# Altium footprint library PCBKU.PcbLib: 197 footprints (part 9 of 13)
Each footprint in its own frame and in the unit in brackets; x right, y up, seen from the top. Pads: shape width x height; smd on the part's side, far side on the other; paste and mask are expansions set on the pad; w line width, h text height; cw(c..) or ccw(c..) is an arc to the next point about the centre after c.
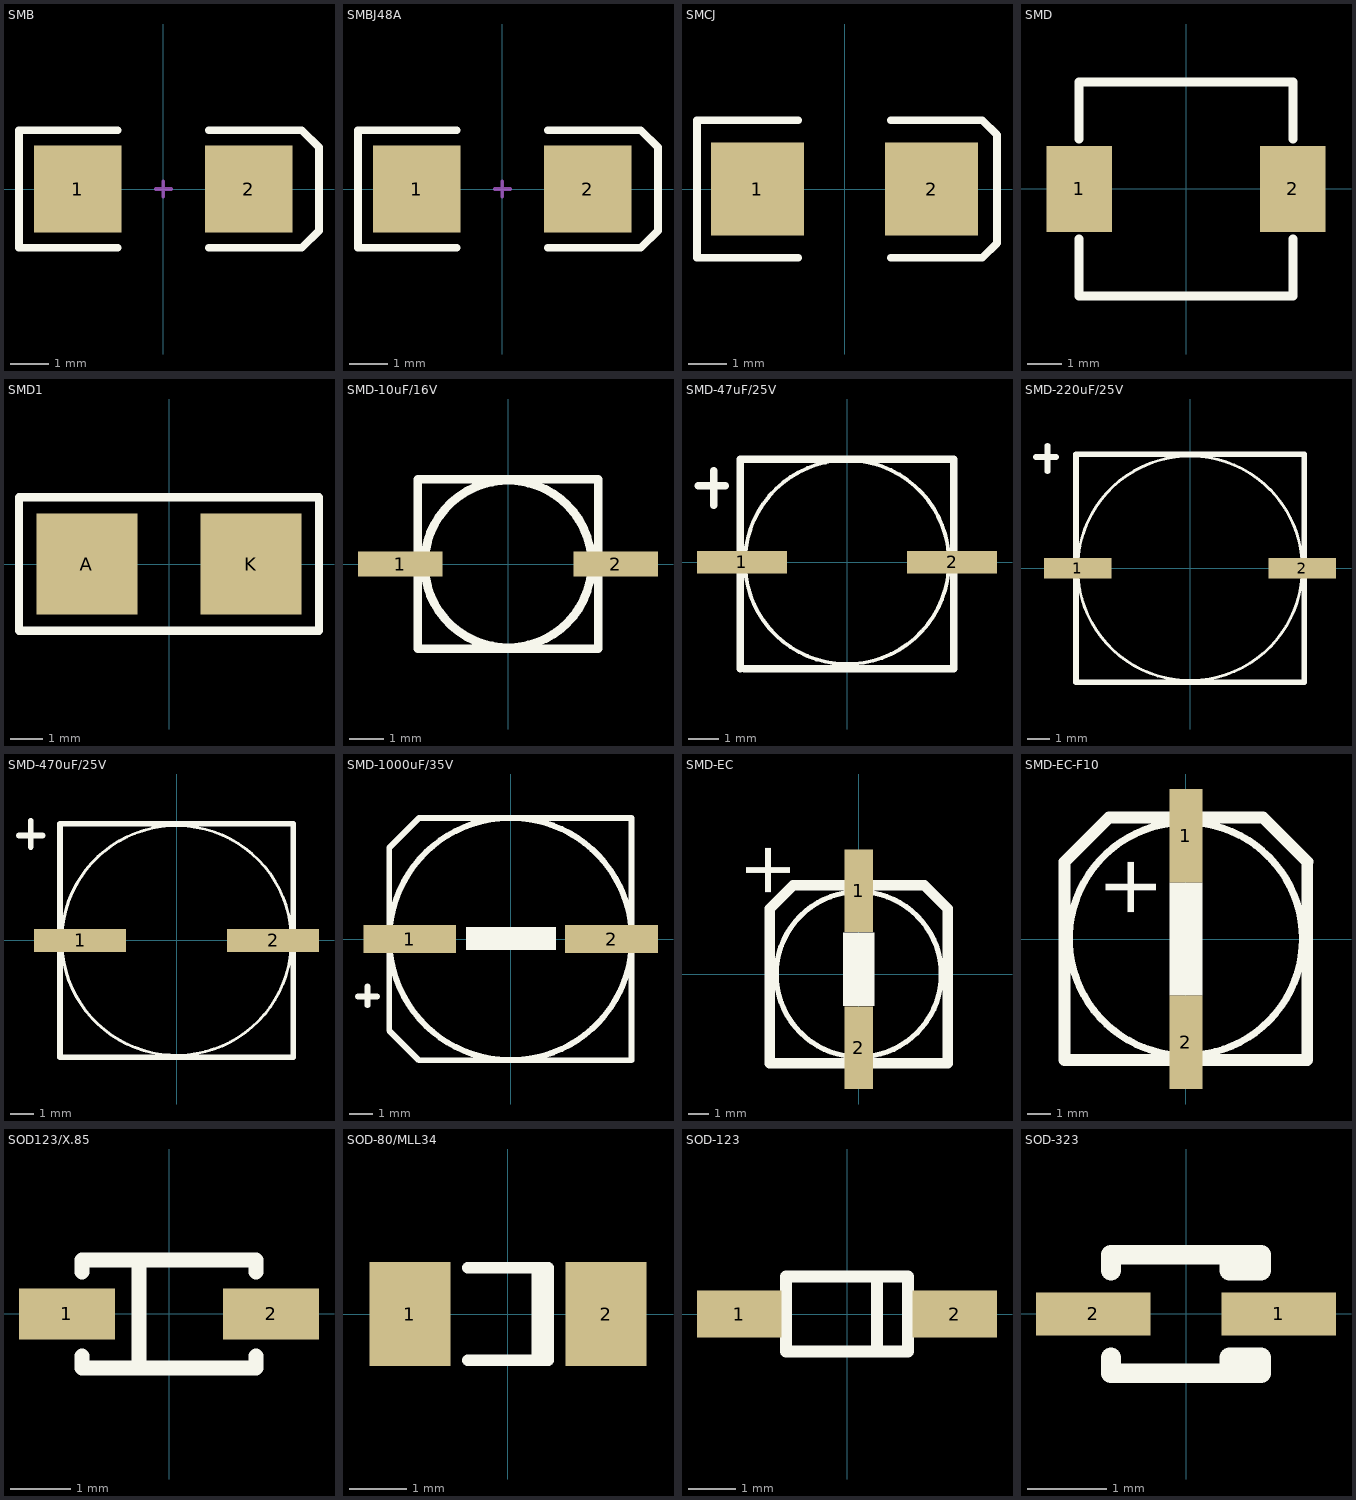
[diagram p8: the footprints below, top view; thin cyan lines are the x and y axes]

## SMB [mm] "DO-214-AA/SMB; 2 C-Bend Leads; Body 5.3 x 3.6 mm, inc. leads (LxW)"
height 2.54
pads (2):
  rect 2.3x2.3 smd: 1(-2.25,0) 2(2.25,0)
Top Overlay:
  lines w0.2: -1.2,-1.55 -3.8,-1.55 -3.8,1.55 -1.2,1.55 ; 1.2,-1.55 3.65,-1.55 4.1,-1.1 4.1,1.1 3.65,1.55 1.2,1.55
Mechanical 1:
  lines w0.1: -0.2,0 0.2,0 ; 0,-0.2 0,0.2

## SMBJ48A [mm]
pads (2):
  rect 2.3x2.3 smd: 1(-2.25,0) 2(2.25,0)
Top Overlay:
  lines w0.2: -1.2,-1.55 -3.8,-1.55 -3.8,1.55 -1.2,1.55 ; 1.2,-1.55 3.65,-1.55 4.1,-1.1 4.1,1.1 3.65,1.55 1.2,1.55
Mechanical 1:
  lines w0.1: -0.2,0 0.2,0 ; 0,-0.2 0,0.2

## SMCJ [mm]
pads (2):
  rect 2.4x2.4 smd: 1(-2.25,0) 2(2.25,0)
Top Overlay:
  lines w0.2: -1.2,-1.778 -3.81,-1.778 -3.81,1.778 -1.2,1.778 ; 1.2,-1.778 3.556,-1.778 3.937,-1.397 3.937,1.397 3.556,1.778 1.2,1.778

## SMD [mm]
pads (2):
  rect 1.9x2.5 smd: 1(-3.099,0) 2(3.099,0)
Top Overlay:
  lines w0.254: -3.099,-1.449 -3.099,-3.1 3.101,-3.1 3.101,-1.449 ; -3.099,1.449 -3.099,3.1 3.101,3.1 3.101,1.449
3D body: height 3, standoff 0.1, extent -3.337,-3.371 3.363,3.329

## SMD1 [mm]
pads (2):
  rect 3.067x3.067 smd: A(-2.5,0) K(2.5,0)
Top Overlay:
  lines w0.254: -4.572,-2.032 -4.572,1.524 -4.572,2.032 4.572,2.032 4.572,-2.032 -4.572,-2.032

## SMD-10uF/16V [mm]
pads (2):
  rect 2.5x0.75 smd: 1(-3.175,0) 2(3.175,0)
Top Overlay:
  circle w0.254: c0,0 r2.466
  lines w0.254: -2.667,-2.5 2.667,-2.5 2.667,2.5 -2.667,2.5 -2.667,-2.5

## SMD-47uF/25V [mm]
pads (2):
  rect 3x0.75 smd: 1(-3.5,0) 2(3.5,0)
Top Overlay:
  circle w0.127: c0,0 r3.4
  lines w0.254: -4.953,2.54 -4.064,2.54 ; -4.445,1.905 -4.445,3.048 ; -3.556,-3.556 -3.556,3.429 0,3.429 3.556,3.429 3.556,-3.556 -3.429,-3.556

## SMD-220uF/25V [mm]
pads (2):
  rect 3x0.9 smd: 1(-5,0) 2(5,0)
Top Overlay:
  circle w0.127: c0,0 r5
  lines w0.254: -6.858,4.953 -5.969,4.953 ; -6.35,4.318 -6.35,5.461 ; -5.08,-5.08 -5.08,5.08 5.08,5.08 5.08,-5.08 -5.08,-5.08

## SMD-470uF/25V [mm]
pads (2):
  rect 4x1 smd: 1(-4.2,0) 2(4.2,0)
Top Overlay:
  circle w0.127: c0,0 r5
  lines w0.254: -6.858,4.572 -5.842,4.572 ; -6.35,4.064 -6.35,5.207 ; -5.08,-5.08 5.08,-5.08 5.08,5.08 -4.445,5.08 -5.08,5.08 -5.08,-5.08

## SMD-1000uF/35V [mm]
pads (2):
  rect 4x1.2 smd: 1(-4.34,0) 2(4.34,0)
Top Overlay:
  circle w0.254: c0,0 r5.214
  rectangle: -1.93,-0.483 1.956,0.508
  lines w0.254: -6.566,-2.471 -5.753,-2.471 ; -6.159,-2.852 -6.159,-2.039 ; -5.22,-3.944 -5.22,3.93 -3.95,5.2 5.194,5.2 5.194,-5.214 -3.95,-5.214 -5.22,-3.944

## SMD-EC [mm]
pads (2):
  rect 1.4x4 smd: 1(0,4.049) 2(0,-3.556)
Top Overlay:
  circle w0.254: c0,0 r4
  region: -0.773,2.032 -0.773,-1.524 0.762,-1.524 0.762,2.032
  lines w0.508: -4.318,-4.318 4.318,-4.318 4.318,3.175 3.175,4.318 -3.175,4.318 -4.318,3.175 -4.318,-4.318
  text "+" at -5.461,6.477 h2.5

## SMD-EC-F10 [mm]
pads (2):
  rect 1.4x4 smd: 1(0,4.43) 2(0,-4.43)
Top Overlay:
  circle w0.305: c0,0.007 r5
  region: -0.701,2.424 -0.701,-2.419 0.707,-2.419 0.707,2.424
  lines w0.508: 5.2,3.307 5.2,-5.19 -5.201,-5.19 -5.201,3.31 -3.304,5.207 3.306,5.207 5.203,3.31
  text "+" at -3.44,3.649 h2.5

## SOD123/X.85 [mm]
height 1.1
pads (2):
  rect 1.6x0.85 smd: 1(-1.7,0) 2(1.7,0)
Top Overlay:
  lines w0.25: -1.45,-0.7 -1.45,-0.9 1.45,-0.9 1.45,-0.7 ; -1.45,0.7 -1.45,0.9 1.45,0.9 1.45,0.7 ; -0.5,-0.9 -0.5,0.9

## SOD-80/MLL34 [mm]
pads (2):
  rect 1.4x1.8 smd: 1(-1.7,0) 2(1.7,0)
Top Overlay:
  lines w0.2: -0.7,-0.8 0.7,-0.8 0.7,0.8 -0.7,0.8 ; 0.51,-0.8 0.51,0.8

## SOD-123 [mm]
height 1.1
pads (2):
  rect 1.8x1 smd: 1(-2.286,0) 2(2.286,0)
Top Overlay:
  lines w0.254: 0.635,-0.8 0.635,0.8 ; -1.3,-0.8 -1.3,0.8 1.3,0.8 1.3,-0.8 -1.3,-0.8
3D body: height 1.27, standoff 0, extent -1.698,-0.813 2.002,0.787

## SOD-323 [mm]
height 1.1
pads (2):
  rect 1.45x0.55 smd: 1(1.175,0) 2(-1.175,0)
Top Overlay:
  lines w0.25: -0.95,-0.55 -0.95,-0.75 0.95,-0.75 0.95,-0.55 0.55,-0.55 0.55,-0.75 ; -0.95,0.55 -0.95,0.75 0.95,0.75 0.95,0.55 0.55,0.55 0.55,0.75